# Altium footprint library KwantLib.PcbLib: 249 footprints (part 10 of 16)
Each footprint in its own frame and in the unit in brackets; x right, y up, seen from the top. Pads: shape width x height; smd on the part's side, far side on the other; paste and mask are expansions set on the pad; w line width, h text height; cw(c..) or ccw(c..) is an arc to the next point about the centre after c.
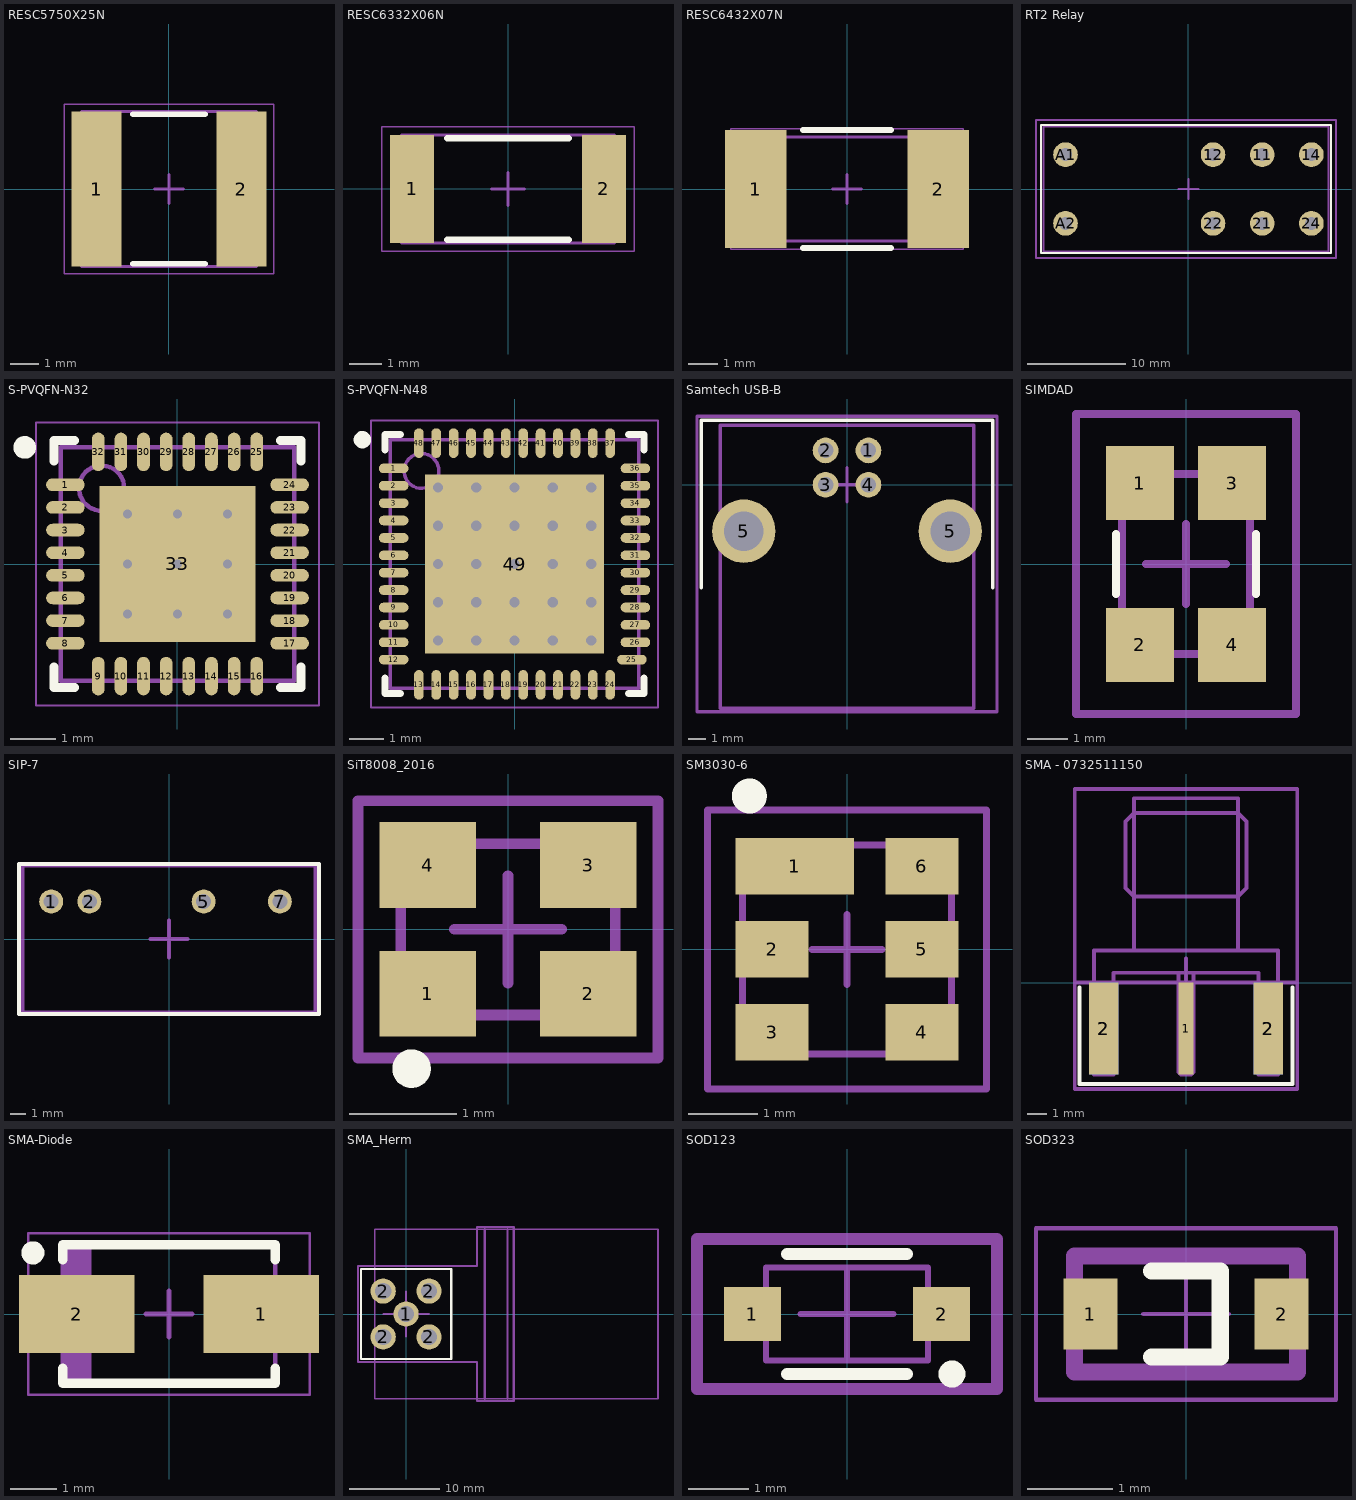
[diagram p9: the footprints below, top view; thin cyan lines are the x and y axes]

## RESC5750X25N [mm] "Chip Resistor, 2-Leads, Body 5.70x5.00mm, IPC Medium Density"
height 2.5
pads (2):
  rect 1.75x5.4 smd paste-0.07 mask+0.07: 1(-2.525,0) 2(2.525,0)
Top Overlay:
  lines w0.2: -1.25,-2.6 1.25,-2.6 ; -1.25,2.6 1.25,2.6
Mechanical 13:
  lines w0.1: -3.05,-2.7 3.05,-2.7 3.05,2.7 -3.05,2.7 -3.05,-2.7
Mechanical 15:
  lines w0.05: -3.65,-2.95 3.65,-2.95 3.65,2.95 -3.65,2.95 -3.65,-2.95
  lines w0.1: -0.5,0 0.5,0 ; 0,-0.5 0,0.5
3D body "RESC5750X25N.step": height 2.5, standoff 0, extent -3.05,-2.7 3.05,2.7

## RESC6332X06N [mm] "Chip Resistor, 2-Leads, Body 6.30x3.20mm, IPC Medium Density"
height 0.6
pads (2):
  rect 1.35x3.3 smd: 1(-2.925,0) 2(2.925,0)
Top Overlay:
  lines w0.2: -1.85,-1.55 1.85,-1.55 ; -1.85,1.55 1.85,1.55
Mechanical 13:
  lines w0.1: -3.25,-1.65 3.25,-1.65 3.25,1.65 -3.25,1.65 -3.25,-1.65
Mechanical 15:
  lines w0.05: -3.85,-1.9 3.85,-1.9 3.85,1.9 -3.85,1.9 -3.85,-1.9
  lines w0.1: -0.5,0 0.5,0 ; 0,-0.5 0,0.5
3D body "RESC6332X06N.step": height 0.6, standoff 0, extent -3.25,-1.65 3.25,1.65

## RESC6432X07N [mm] "Chip Resistor, 2-Leads, Body 6.4x3.2mm, IPC Medium Density"
height 0.7
pads (2):
  rect 2.1x4 smd: 1(-3.1,0) 2(3.1,0)
Top Overlay:
  lines w0.2: -1.5,-2 1.5,-2 ; -1.5,2 1.5,2
Mechanical 13:
  lines w0.1: -3.325,-1.775 3.325,-1.775 3.325,1.775 -3.325,1.775 -3.325,-1.775
Mechanical 15:
  lines w0.05: -3.95,-2.05 3.95,-2.05 3.95,2.05 -3.95,2.05 -3.95,-2.05
  lines w0.1: -0.5,0 0.5,0 ; 0,-0.5 0,0.5
3D body "RESC6533X07N.step": height 0.7, standoff 0, extent -3.325,-1.775 3.325,1.775

## RT2 Relay [mm]
height 15.7
pads (8):
  round 2.5 hole 1.3: 11(7.5,3.5) 12(2.5,3.5) 14(12.5,3.5) 21(7.5,-3.5) 22(2.5,-3.5) 24(12.5,-3.5) A1(-12.5,3.5) A2(-12.5,-3.5)
Top Overlay:
  lines w0.2: -15,-6.5 -15,6.5 14.5,6.5 14.5,-6.5 -15,-6.5
Mechanical 13:
  lines w0.2: -14.75,-6.35 -14.75,6.35 14.25,6.35 14.25,-6.35 -14.75,-6.35
Mechanical 15:
  lines w0.2: -1,0 1,0 ; 0,-1 0,1 ; -15.5,-7 -15.5,7 15,7 15,-7 -15.5,-7
3D body "Relay3d.stp": height 15.8, standoff -3.5, extent -14.75,-6.35 14.25,6.35

## S-PVQFN-N32 [mm] "QFN, 32-Leads, Body 5,00x5,00mm, Pitch 0,50mm, Thermal Pad 3,45x3,45mm, IPC Medium Density"
height 1
pads (33):
  oval 0.85x0.28 smd paste-0.02 mask+0.07: 1(-2.475,1.75) 2(-2.475,1.25) 3(-2.475,0.75) 4(-2.475,0.25) 5(-2.475,-0.25) 6(-2.475,-0.75) 7(-2.475,-1.25) 8(-2.475,-1.75) 17(2.475,-1.75) 18(2.475,-1.25) 19(2.475,-0.75) 20(2.475,-0.25) 21(2.475,0.25) 22(2.475,0.75) 23(2.475,1.25) 24(2.475,1.75)
  oval 0.28x0.85 smd paste-0.02 mask+0.07: 9(-1.75,-2.475) 10(-1.25,-2.475) 11(-0.75,-2.475) 12(-0.25,-2.475) 13(0.25,-2.475) 14(0.75,-2.475) 15(1.25,-2.475) 16(1.75,-2.475) 25(1.75,2.475) 26(1.25,2.475) 27(0.75,2.475) 28(0.25,2.475) 29(-0.25,2.475) 30(-0.75,2.475) 31(-1.25,2.475) 32(-1.75,2.475)
  rect 3.45x3.45 smd paste-5 mask+0.07: 33(0,0)
via 0,0 diameter 0.5 hole 0.2
via 1.1,-1.1 diameter 0.5 hole 0.2
via 0,-1.1 diameter 0.5 hole 0.2
via -1.1,-1.1 diameter 0.5 hole 0.2
via 1.1,0 diameter 0.5 hole 0.2
via -1.1,0 diameter 0.5 hole 0.2
via 1.1,1.1 diameter 0.5 hole 0.2
via 0,1.1 diameter 0.5 hole 0.2
via -1.1,1.1 diameter 0.5 hole 0.2
Top Overlay:
  circle w0.25: c-3.375,2.575 r0.125
  lines w0.2: -2.725,-2.275 -2.725,-2.725 -2.275,-2.725 ; -2.725,2.275 -2.725,2.725 -2.275,2.725 ; 2.275,-2.725 2.725,-2.725 2.725,-2.275 ; 2.275,2.725 2.725,2.725 2.725,2.275
Top Paste:
  rectangle: 0.15,0.15 1.6,1.6
  rectangle: 0.15,-1.6 1.6,-0.15
  rectangle: -1.6,-1.6 -0.15,-0.15
  rectangle: -1.6,0.15 -0.15,1.6
Mechanical 13:
  circle w0.1: c-1.675,1.675 r0.5
  lines w0.1: -2.575,-2.575 2.575,-2.575 2.575,2.575 -2.575,2.575 -2.575,-2.575
Mechanical 15:
  lines w0.05: -3.125,-3.125 3.125,-3.125 3.125,3.125 -3.125,3.125 -3.125,-3.125
  lines w0.1: -0.5,0 0.5,0 ; 0,-0.5 0,0.5
3D body "S-PVQFN-N32.step": height 1, standoff 0, extent -2.585,-2.585 2.585,2.585

## S-PVQFN-N48 [mm]
height 1
pads (49):
  oval 0.85x0.28 smd: 1(-3.475,2.75) 2(-3.475,2.25) 3(-3.475,1.75) 4(-3.475,1.25) 5(-3.475,0.75) 6(-3.475,0.25) 7(-3.475,-0.25) 8(-3.475,-0.75) 9(-3.475,-1.25) 10(-3.475,-1.75) 11(-3.475,-2.25) 12(-3.475,-2.75) 25(3.375,-2.75) 26(3.475,-2.25) 27(3.475,-1.75) 28(3.475,-1.25) 29(3.475,-0.75) 30(3.475,-0.25) 31(3.475,0.25) 32(3.475,0.75) 33(3.475,1.25) 34(3.475,1.75) 35(3.475,2.25) 36(3.475,2.75)
  oval 0.28x0.85 smd: 13(-2.75,-3.475) 14(-2.25,-3.475) 15(-1.75,-3.475) 16(-1.25,-3.475) 17(-0.75,-3.475) 18(-0.25,-3.475) 19(0.25,-3.475) 20(0.75,-3.475) 21(1.25,-3.475) 22(1.75,-3.475) 23(2.25,-3.475) 24(2.75,-3.475) 37(2.75,3.475) 38(2.25,3.475) 39(1.75,3.475) 40(1.25,3.475) 41(0.75,3.475) 42(0.25,3.475) 43(-0.25,3.475) 44(-0.75,3.475) 45(-1.25,3.475) 46(-1.75,3.475) 47(-2.25,3.475) 48(-2.75,3.475)
  rect 5.15x5.15 smd: 49(0,0)
via -2.2,2.2 diameter 0.6 hole 0.3
via -1.1,2.2 diameter 0.6 hole 0.3
via 0,2.2 diameter 0.6 hole 0.3
via 1.1,2.2 diameter 0.6 hole 0.3
via 2.2,2.2 diameter 0.6 hole 0.3
via -2.2,1.1 diameter 0.6 hole 0.3
via -1.1,1.1 diameter 0.6 hole 0.3
via 0,1.1 diameter 0.6 hole 0.3
via 1.1,1.1 diameter 0.6 hole 0.3
via 2.2,1.1 diameter 0.6 hole 0.3
via -2.2,0 diameter 0.6 hole 0.3
via -1.1,0 diameter 0.6 hole 0.3
via 0,0 diameter 0.6 hole 0.3
via 1.1,0 diameter 0.6 hole 0.3
via 2.2,0 diameter 0.6 hole 0.3
via -2.2,-1.1 diameter 0.6 hole 0.3
via -1.1,-1.1 diameter 0.6 hole 0.3
via 0,-1.1 diameter 0.6 hole 0.3
via 1.1,-1.1 diameter 0.6 hole 0.3
via 2.2,-1.1 diameter 0.6 hole 0.3
via -2.2,-2.2 diameter 0.6 hole 0.3
via -1.1,-2.2 diameter 0.6 hole 0.3
via 0,-2.2 diameter 0.6 hole 0.3
via 1.1,-2.2 diameter 0.6 hole 0.3
via 2.2,-2.2 diameter 0.6 hole 0.3
Top Overlay:
  circle w0.25: c-4.375,3.575 r0.125
  lines w0.2: -3.725,-3.275 -3.725,-3.725 -3.275,-3.725 ; -3.725,3.275 -3.725,3.725 -3.275,3.725 ; 3.275,-3.725 3.725,-3.725 3.725,-3.275 ; 3.275,3.725 3.725,3.725 3.725,3.275
Mechanical 13:
  circle w0.1: c-2.675,2.675 r0.5
  lines w0.1: -3.575,-3.575 -3.575,3.575 3.575,3.575 3.575,-3.575 -3.575,-3.575
Mechanical 15:
  lines w0.05: -4.125,-4.125 -4.125,4.125 4.125,4.125 4.125,-4.125 -4.125,-4.125
  lines w0.1: -0.5,0 0.5,0 ; 0,-0.5 0,0.5
3D body "QFN50P700X700X100_HS-49N.step": height 1, standoff 0, extent -3.585,-3.585 3.585,3.585

## Samtech USB-B [mm]
height 10.8
pads (6):
  round 1.5 hole 0.9: 1(1.25,2) 2(-1.25,2) 3(-1.25,0) 4(1.25,0)
  round 3.7 hole 2.3: 5(-6.02,-2.71) 5(6.02,-2.71)
Top Overlay:
  lines w0.2: -8.5,-6 -8.5,3.75 8.5,3.75 8.5,-6
Mechanical 13:
  lines w0.2: -7.4,-13.03 -7.4,3.47 7.398,3.47 7.398,-13.03 -7.4,-13.03
Mechanical 15:
  lines w0.2: -1,0 1,0 ; 0,-1 0,1 ; -8.75,-13.25 -8.75,4 8.75,4 8.75,-13.25 -8.75,-13.25
3D body "USB-B.stp": height 11.2, standoff -3.44, extent -7.4,-13.03 7.398,3.47

## SIMDAD [mm] "Data and signal line choke"
height 3
pads (4):
  rect 1.7x1.85 smd paste-0.05 mask+0.07: 1(-1.15,2.025) 2(-1.15,-2.025) 3(1.15,2.025) 4(1.15,-2.025)
Top Overlay:
  lines w0.2: -1.75,-0.75 -1.75,0.75 ; 1.75,-0.75 1.75,0.75
Mechanical 13:
  lines w0.2: -1.6,-2.25 1.6,-2.25 1.6,2.25 -1.6,2.25 -1.6,-2.25
Mechanical 15:
  lines w0.2: -1,0 1,0 ; 0,-1 0,1 ; -2.75,-3.75 2.75,-3.75 2.75,3.75 -2.75,3.75 -2.75,-3.75
3D body: height 3, standoff 0.1, extent -1.6,-2.25 1.6,2.25

## SIP-7 [mm] "RxxP2xxS DC-DC pattern"
height 12.5
pads (4):
  round 1.6 hole 1: 1(-7.85,2.5) 2(-5.31,2.5) 5(2.31,2.5) 7(7.39,2.5)
Top Overlay:
  lines w0.25: -10,-5 10,-5 10,5 -10,5 -10,-5
Mechanical 13:
  lines w0.25: -9.75,-4.9 9.75,-4.9 9.75,4.9 -9.75,4.9 -9.75,-4.9
Mechanical 15:
  lines w0.25: -1.25,0 1.25,0 ; 0,-1.25 0,1.25
3D body: height 12.5, standoff 0.01, extent -9.75,-4.9 9.75,4.9

## SiT8008_2016 [mm]
height 0.75
pads (4):
  rect 0.9x0.8 smd paste-0.03 mask+0.07: 1(-0.75,-0.6) 2(0.75,-0.6) 3(0.75,0.6) 4(-0.75,0.6)
Top Overlay:
  circle w0.2: c-0.9,-1.3 r0.08
Mechanical 13:
  lines w0.1: -1,-0.8 -1,0.8 1,0.8 1,-0.8 -1,-0.8
Mechanical 15:
  lines w0.1: -0.5,0 0.5,0 ; 0,-0.5 0,0.5 ; -1.4,-1.2 -1.4,1.2 1.4,1.2 1.4,-1.2 -1.4,-1.2
3D body "SiT8008.stp": height 0.76, standoff 0, extent -1,-0.8 1,0.8

## SM3030-6 [mm]
height 1.25
pads (6):
  rect 1.7x0.81 smd: 1(-0.75,1.19)
  rect 1.05x0.81 smd: 2(-1.075,0) 3(-1.075,-1.19) 4(1.075,-1.19) 5(1.075,0) 6(1.075,1.19)
Top Overlay:
  circle w0.3: c-1.4,2.2 r0.1
Mechanical 13:
  lines w0.1: -1.5,-1.5 1.5,-1.5 1.5,1.5 -1.5,1.5 -1.5,-1.5
Mechanical 15:
  lines w0.1: -0.5,0 0.5,0 ; 0,-0.5 0,0.5 ; -2,-2 2,-2 2,2 -2,2 -2,-2
3D body "SM3030-6.stp": height 1.27, standoff 0.01, extent -1.5,-1.5 1.5,1.5

## SMA - 0732511150 [mm]
pads (5):
  rect 0.8x4.75 smd paste-3: 1(0,-2.375)
  rect 1.5x4.75 smd paste-3: 2(-4.25,-2.375) 2(4.25,-2.375)
  rect 1.5x4.75 smd far side paste-3: 2(-4.25,-2.375) 2(4.25,-2.375)
Top Overlay:
  lines w0.2: -5.5,-0.25 -5.5,-5.25 5.5,-5.25 5.5,-0.25
Mechanical 13:
  lines w0.2: -2.68,1.651 -2.68,4.445 ; -0.381,0.508 -0.381,-4.623 ; 0.381,0.508 0.381,-4.623 ; 2.68,1.651 2.68,4.445 ; -4.763,0 -4.763,1.651 4.763,1.651 4.763,0 ; -4.763,0 -4.763,-4.75 -3.746,-4.75 -3.746,0 ; -4.763,0 -3.746,0 ; -3.746,0 -3.746,0.508 3.746,0.508 3.746,0 ; -2.68,4.445 -3.129,4.894 -3.129,8.314 -2.68,8.763 ; -2.68,4.445 -2.68,8.763 ; -2.68,4.445 2.68,4.445 ; -2.68,8.763 -2.68,9.525 2.68,9.525 2.68,8.763 ; -2.68,8.763 2.68,8.763 ; -0.381,-4.623 -0.254,-4.75 0.254,-4.75 0.381,-4.623 ; -0.381,-4.623 0,-4.623 0.381,-4.623 ; 2.68,4.445 3.129,4.894 3.129,8.314 2.68,8.763 ; 2.68,4.445 2.68,8.763 ; 3.746,0 3.746,-4.75 4.763,-4.75 4.763,0 ; 3.746,0 4.763,0
Mechanical 15:
  lines w0.2: -5.75,0 5.75,0 ; -1.25,0 1.25,0 ; 0,-1.25 0,1.25 ; -5.75,-5.5 -5.75,10 5.75,10 5.75,-5.5 -5.75,-5.5
3D body "SMA-0732511150.stp": height 4.34, standoff -3.58, extent -4.762,-4.75 4.763,9.525

## SMA-Diode [mm] "Molded Diode, 2-Leads, Body 4.30x2.60mm, IPC Medium Density"
height 2.2
pads (2):
  rect 2.5x1.7 smd mask+0.075: 1(2,0) 2(-2,0)
Top Overlay:
  circle w0.25: c-2.95,1.325 r0.125
  lines w0.2: -2.3,-1.175 -2.3,-1.5 2.3,-1.5 2.3,-1.175 ; -2.3,1.175 -2.3,1.5 2.3,1.5 2.3,1.175
Mechanical 13:
  rectangle: -2.3,-1.46 -1.681,1.46
  lines w0.1: -2.3,-1.46 2.3,-1.46 2.3,1.46 -2.3,1.46 -2.3,-1.46
Mechanical 15:
  lines w0.05: -3.05,-1.75 3.05,-1.75 3.05,1.75 -3.05,1.75 -3.05,-1.75
  lines w0.1: -0.5,0 0.5,0 ; 0,-0.5 0,0.5
3D body "SMA.step": height 2.2, standoff 0, extent -2.52,-1.46 2.52,1.46

## SMA_Herm [mm] "SMA герметичный на плату"
pads (5):
  round 2.8 hole 1.8: 1(0,0) 2(-2.54,-2.54) 2(-2.54,2.54) 2(2.54,-2.54) 2(2.54,2.54)
Top Overlay:
  lines w0.25: -5,-5 -5,5 5,5 5,-5 -5,-5
Mechanical 13:
  lines w0.2: -3.478,-9.4 27.939,-9.4 27.939,9.4 -3.478,9.4 -3.478,-9.4
  lines w0.25: 8.71,-9.4 8.71,9.4 ; 11.25,-9.4 11.25,9.4
Mechanical 15:
  lines w0.25: -2.5,0 2.5,0 ; 0,-2.5 0,2.5 ; -5.334,-5.334 -5.334,5.334 7.874,5.334 7.874,9.652 11.176,9.652 11.938,9.652 11.938,-9.652 7.874,-9.652 7.874,-5.334 -5.334,-5.334
3D body "901-10385.stp": height 14.4, standoff -4.4, extent -3.478,-9.4 27.939,9.4

## SOD123 [mm] "Diode 2.7x1.55 mm"
height 1.1
pads (2):
  rect 0.95x0.9 smd mask+0.075: 1(-1.575,0) 2(1.575,0)
Top Overlay:
  circle w0.25: c1.75,-1 r0.1
  lines w0.2: -1,-1 1,-1 ; -1,1 1,1
Mechanical 13:
  lines w0.1: -1.35,-0.775 1.35,-0.775 1.35,0.775 -1.35,0.775 -1.35,-0.775
Mechanical 15:
  lines w0.1: -0.775,0 0.775,0 ; 0,-0.775 0,0.775
  lines w0.2: -2.5,-1.25 -2.5,1.25 2.5,1.25 2.5,-1.25 -2.5,-1.25
3D body "User Library-SOD-123.step": height 1.25, standoff 0, extent -1.849,-0.8 1.849,0.8

## SOD323 [mm] "Diode 1.7x1.25 mm"
height 0.9
pads (2):
  rect 0.63x0.83 smd paste-0.03 mask+0.075: 1(-1.115,0) 2(1.115,0)
Top Overlay:
  lines w0.2: -0.4,-0.5 0.4,-0.5 0.4,0.5 -0.4,0.5
Mechanical 13:
  lines w0.2: -1.3,-0.675 -1.3,0.675 1.3,0.675 1.3,-0.675 -1.3,-0.675
Mechanical 15:
  lines w0.05: -0.5,0 0.5,0 ; 0,-0.5 0,0.5 ; -1.75,-1 1.75,-1 1.75,1 -1.75,1 -1.75,-1
3D body "User Library-SOD323-1.step": height 1.1, standoff 0, extent -1.3,-0.675 1.3,0.675